# Altium footprint library C210_Rev_B_220601.PcbLib: 80 footprints (part 4 of 5)
Each footprint in its own frame and in the unit in brackets; x right, y up, seen from the top. Pads: shape width x height; smd on the part's side, far side on the other; paste and mask are expansions set on the pad; w line width, h text height; cw(c..) or ccw(c..) is an arc to the next point about the centre after c.
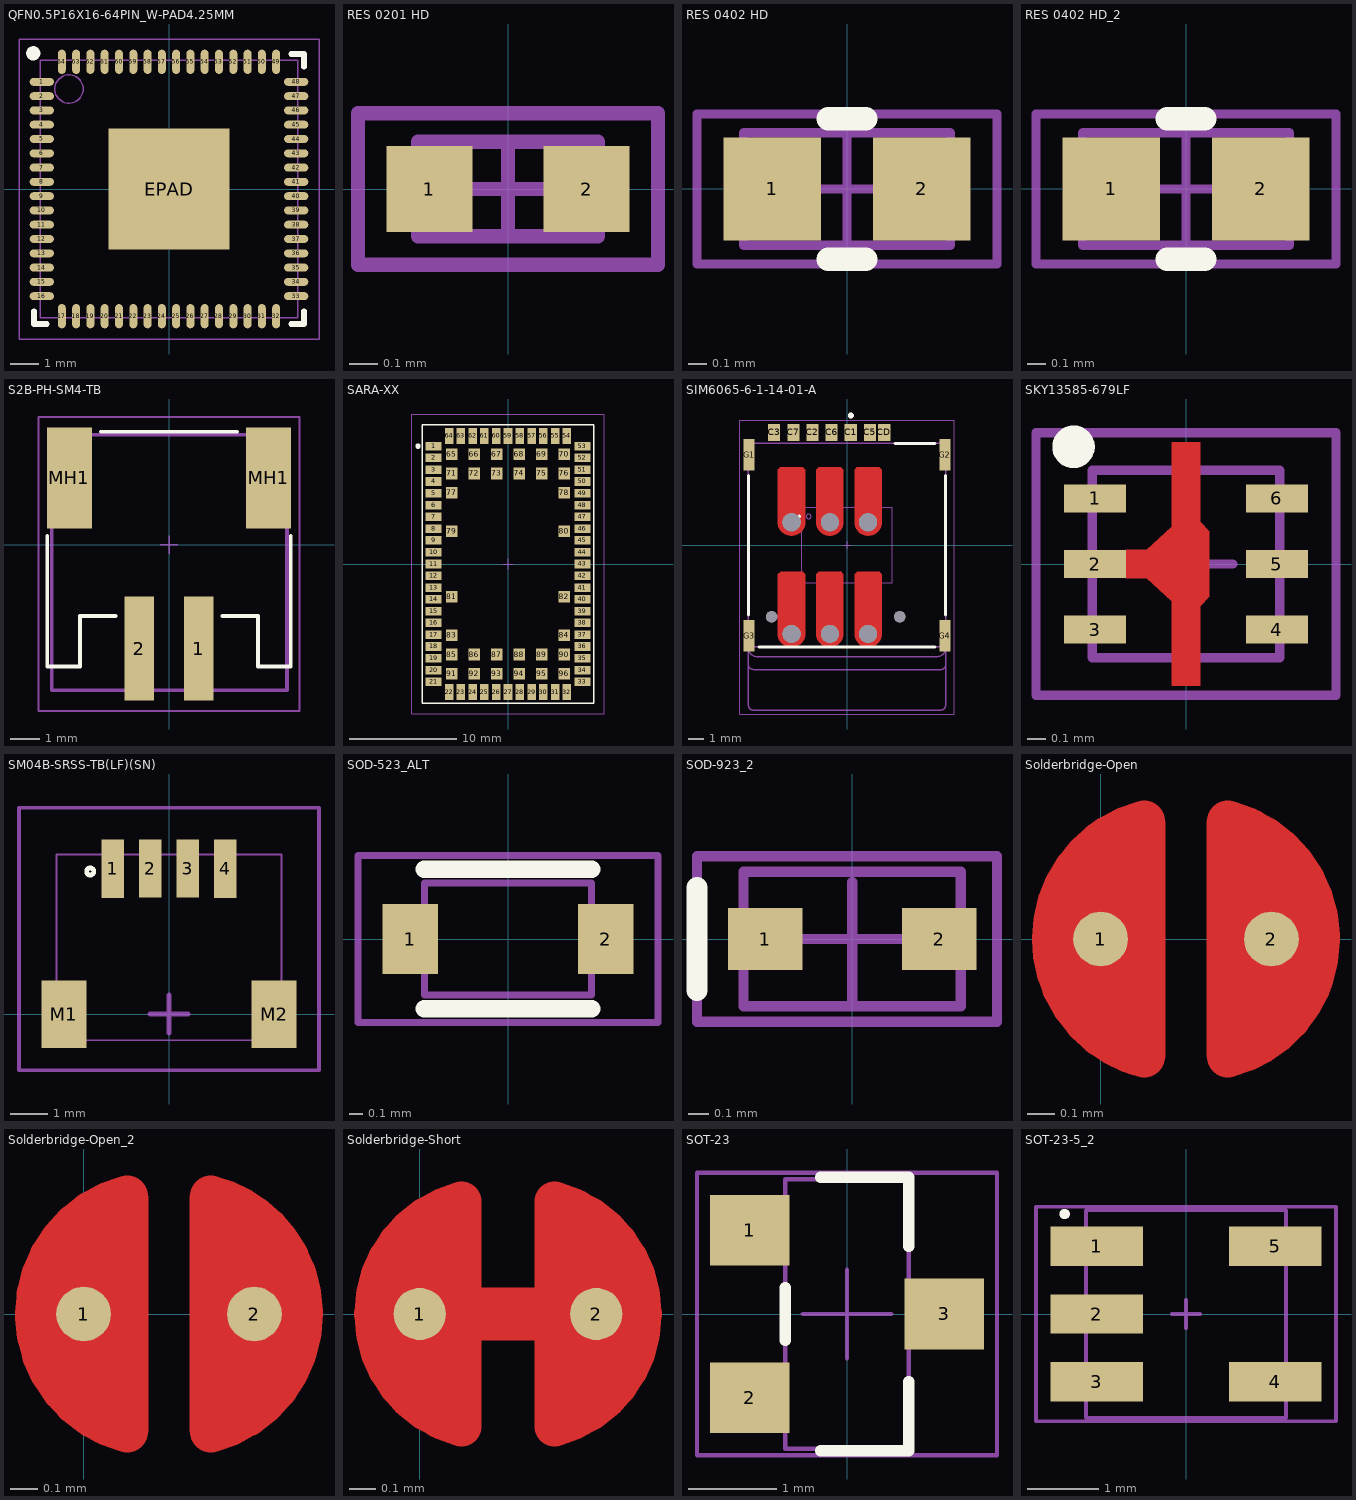
[diagram p3: the footprints below, top view; thin cyan lines are the x and y axes]

## QFN0.5P16X16-64PIN_W-PAD4.25MM [mm]
pads (65):
  oval 0.85x0.28 smd: 1(-4.45,3.75) 2(-4.45,3.25) 3(-4.45,2.75) 4(-4.45,2.25) 5(-4.45,1.75) 6(-4.45,1.25) 7(-4.45,0.75) 8(-4.45,0.25) 9(-4.45,-0.25) 10(-4.45,-0.75) 11(-4.45,-1.25) 12(-4.45,-1.75) 13(-4.45,-2.25) 14(-4.45,-2.75) 15(-4.45,-3.25) 16(-4.45,-3.75) 33(4.45,-3.75) 34(4.45,-3.25) 35(4.45,-2.75) 36(4.45,-2.25) 37(4.45,-1.75) 38(4.45,-1.25) 39(4.45,-0.75) 40(4.45,-0.25) 41(4.45,0.25) 42(4.45,0.75) 43(4.45,1.25) 44(4.45,1.75) 45(4.45,2.25) 46(4.45,2.75) 47(4.45,3.25) 48(4.45,3.75)
  oval 0.28x0.85 smd: 17(-3.75,-4.45) 18(-3.25,-4.45) 19(-2.75,-4.45) 20(-2.25,-4.45) 21(-1.75,-4.45) 22(-1.25,-4.45) 23(-0.75,-4.45) 24(-0.25,-4.45) 25(0.25,-4.45) 26(0.75,-4.45) 27(1.25,-4.45) 28(1.75,-4.45) 29(2.25,-4.45) 30(2.75,-4.45) 31(3.25,-4.45) 32(3.75,-4.45) 49(3.75,4.45) 50(3.25,4.45) 51(2.75,4.45) 52(2.25,4.45) 53(1.75,4.45) 54(1.25,4.45) 55(0.75,4.45) 56(0.25,4.45) 57(-0.25,4.45) 58(-0.75,4.45) 59(-1.25,4.45) 60(-1.75,4.45) 61(-2.25,4.45) 62(-2.75,4.45) 63(-3.25,4.45) 64(-3.75,4.45)
  rect 4.25x4.25 smd paste-2.1: EPAD(0,0)
Top Overlay:
  circle w0.25: c-4.75,4.75 r0.125
  lines w0.2: -4.725,-4.275 -4.725,-4.725 -4.275,-4.725 ; 4.275,-4.725 4.725,-4.725 4.725,-4.275 ; 4.275,4.725 4.725,4.725 4.725,4.275
Top Paste:
  rectangle: -0.575,-0.575 0.575,0.575
  rectangle: -2.025,-0.575 -0.875,0.575
  rectangle: -2.025,-2.025 -0.875,-0.875
  rectangle: -0.575,-2.025 0.575,-0.875
  rectangle: 0.875,-2.025 2.025,-0.875
  rectangle: 0.875,-0.575 2.025,0.575
  rectangle: 0.875,0.875 2.025,2.025
  rectangle: -0.575,0.875 0.575,2.025
  rectangle: -2.025,0.875 -0.875,2.025
Mechanical 11:
  text ".Designator" at -0.033,0.475 h0.5
Mechanical 13:
  circle w0.05: c-3.5,3.5 r0.5
  lines w0.05: -4.5,-4.5 4.5,-4.5 4.5,4.5 -4.5,4.5 -4.5,-4.5
Mechanical 15:
  lines w0.05: -0.5,0 0.5,0 ; 0,-0.5 0,0.5 ; -5.25,-5.25 -5.25,5.25 5.25,5.25 5.25,-5.25 -5.25,-5.25
3D body "User Library-SiLabs QFN64 (9x9).step": height 0.9, standoff 0, extent -4.5,-4.5 4.5,4.5

## RES 0201 HD [mm]
pads (2):
  rect 0.3x0.3 smd mask+0.05: 1(-0.275,0) 2(0.275,0)
Mechanical 11:
  text ".Designator" at -0.6,-0.268 h0.5
Mechanical 13:
  lines w0.05: -0.315,-0.165 -0.315,0.165 0.315,0.165 0.315,-0.165 -0.315,-0.165
Mechanical 15:
  lines w0.05: -0.165,0 0.165,0 ; 0,-0.165 0,0.165 ; -0.525,-0.265 0.525,-0.265 0.525,0.265 -0.525,0.265 -0.525,-0.265
3D body: height 0.25, standoff 0, extent -0.165,-0.165 0.165,0.165
3D body: height 0.25, standoff 0, extent -0.315,-0.165 -0.165,0.165
3D body: height 0.25, standoff 0, extent 0.165,-0.165 0.315,0.165

## RES 0402 HD [mm]
pads (2):
  rect 0.52x0.55 smd: 1(-0.4,0) 2(0.4,0)
Top Overlay:
  lines w0.127: -0.1,-0.375 0.1,-0.375 ; -0.1,0.375 0.1,0.375
Mechanical 11:
  text ".Designator" at 0.725,0.25 h0.5
Mechanical 13:
  lines w0.05: -0.55,-0.3 -0.55,0.3 0.55,0.3 0.55,-0.3 -0.55,-0.3
Mechanical 15:
  lines w0.05: -0.3,0 0.3,0 ; 0,-0.3 0,0.3 ; -0.8,-0.4 -0.8,0.4 0.8,0.4 0.8,-0.4 -0.8,-0.4
3D body: height 0.4, standoff 0, extent -0.35,-0.3 0.35,0.3
3D body: height 0.4, standoff 0, extent -0.55,-0.3 -0.35,0.3
3D body: height 0.4, standoff 0, extent 0.35,-0.3 0.55,0.3

## RES 0402 HD_2 [mm]
pads (2):
  rect 0.52x0.55 smd: 1(-0.4,0) 2(0.4,0)
Top Overlay:
  lines w0.127: -0.1,-0.375 0.1,-0.375 ; -0.1,0.375 0.1,0.375
Mechanical 11:
  text ".Designator" at -0.375,-0.25 h0.5
Mechanical 13:
  lines w0.05: -0.55,-0.3 0.55,-0.3 0.55,0.3 -0.55,0.3 -0.55,-0.3
Mechanical 15:
  lines w0.05: -0.3,0 0.3,0 ; 0,-0.3 0,0.3 ; -0.8,-0.4 0.8,-0.4 0.8,0.4 -0.8,0.4 -0.8,-0.4
3D body: height 0.4, standoff 0, extent -0.35,-0.3 0.35,0.3
3D body: height 0.4, standoff 0, extent -0.55,-0.3 -0.35,0.3
3D body: height 0.4, standoff 0, extent 0.35,-0.3 0.55,0.3

## S2B-PH-SM4-TB [mm]
pads (4):
  rect 1x3.5 smd: 1(1,-3.5) 2(-1,-3.5)
  rect 1.5x3.4 smd: MH1(-3.35,2.25) MH1(3.35,2.25)
Top Overlay:
  lines w0.127: -4.1,0.3 -4.1,-4.1 -3,-4.1 -3,-2.4 -1.8,-2.4 ; -2.3,3.8 2.3,3.8 ; 1.8,-2.4 3,-2.4 3,-4.1 4.1,-4.1 4.1,0.3
Mechanical 11:
  text ".Designator" at -0.575,0.092 h0.5
Mechanical 13:
  lines w0.127: -3.95,-4.9 -3.95,3.7 3.975,3.7 3.975,-4.9 -3.95,-4.9
Mechanical 15:
  lines w0.05: -0.3,0 0.3,0 ; 0,-0.3 0,0.3
  lines w0.064: -4.4,-5.6 4.4,-5.6 4.4,4.3 -4.4,4.3 -4.4,-5.6
3D body "S2B-PH-SM4-TB.STEP": height 5.61, standoff 0.01, extent -3.925,-4.9 3.975,3.7

## SARA-XX [mm]
pads (96):
  rect 1.5x0.8 smd paste-1: 1(-6.95,11) 2(-6.95,9.9) 3(-6.95,8.8) 4(-6.95,7.7) 5(-6.95,6.6) 6(-6.95,5.5) 7(-6.95,4.4) 8(-6.95,3.3) 9(-6.95,2.2) 10(-6.95,1.1) 11(-6.95,0) 12(-6.95,-1.1) 13(-6.95,-2.2) 14(-6.95,-3.3) 15(-6.95,-4.4) 16(-6.95,-5.5) 17(-6.95,-6.6) 18(-6.95,-7.7) 19(-6.95,-8.8) 20(-6.95,-9.9) 21(-6.95,-11) 33(6.95,-11) 34(6.95,-9.9) 35(6.95,-8.8) 36(6.95,-7.7) 37(6.95,-6.6) 38(6.95,-5.5) 39(6.95,-4.4) 40(6.95,-3.3) 41(6.95,-2.2) 42(6.95,-1.1) 43(6.95,0) 44(6.95,1.1) 45(6.95,2.2) 46(6.95,3.3) 47(6.95,4.4) 48(6.95,5.5) 49(6.95,6.6) 50(6.95,7.7) 51(6.95,8.8) 52(6.95,9.9) 53(6.95,11)
  rect 0.8x1.5 smd paste-1: 22(-5.5,-11.95) 23(-4.4,-11.95) 24(-3.3,-11.95) 25(-2.2,-11.95) 26(-1.1,-11.95) 27(0,-11.95) 28(1.1,-11.95) 29(2.2,-11.95) 30(3.3,-11.95) 31(4.4,-11.95) 32(5.5,-11.95) 54(5.5,11.95) 55(4.4,11.95) 56(3.3,11.95) 57(2.2,11.95) 58(1.1,11.95) 59(0,11.95) 60(-1.1,11.95) 61(-2.2,11.95) 62(-3.3,11.95) 63(-4.4,11.95) 64(-5.5,11.95)
  rect 1.1x1.1 smd paste-0.025: 65(-5.25,10.25) 66(-3.15,10.25) 67(-1.05,10.25) 68(1.05,10.25) 69(3.15,10.25) 70(5.25,10.25) 71(-5.25,8.45) 72(-3.15,8.45) 73(-1.05,8.45) 74(1.05,8.45) 75(3.15,8.45) 76(5.25,8.45) 77(-5.25,6.65) 78(5.25,6.65) 79(-5.25,3.05) 80(5.25,3.05) 81(-5.25,-3.05) 82(5.25,-3.05) 83(-5.25,-6.65) 84(5.25,-6.65) 85(-5.25,-8.45) 86(-3.15,-8.45) 87(-1.05,-8.45) 88(1.05,-8.45) 89(3.15,-8.45) 90(5.25,-8.45) 91(-5.25,-10.25) 92(-3.15,-10.25) 93(-1.05,-10.25) 94(1.05,-10.25) 95(3.15,-10.25) 96(5.25,-10.25)
Top Overlay:
  circle w0.4: c-8.4,11 r0.05
  lines w0.15: -8,-13 8,-13 8,13 -8,13 -8,-13
Top Paste:
  rectangle: -7.775,10.625 -6.225,11.375
  rectangle: -7.775,9.525 -6.225,10.275
  rectangle: -7.775,8.425 -6.225,9.175
  rectangle: -7.775,7.325 -6.225,8.075
  rectangle: -7.775,6.225 -6.225,6.975
  rectangle: -7.775,5.125 -6.225,5.875
  rectangle: -7.775,4.025 -6.225,4.775
  rectangle: -7.775,2.925 -6.225,3.675
  rectangle: -7.775,1.825 -6.225,2.575
  rectangle: -7.775,0.725 -6.225,1.475
  rectangle: -7.775,-0.375 -6.225,0.375
  rectangle: -7.775,-1.475 -6.225,-0.725
  rectangle: -7.775,-2.575 -6.225,-1.825
  rectangle: -7.775,-3.675 -6.225,-2.925
  rectangle: -7.775,-4.775 -6.225,-4.025
  rectangle: -7.775,-5.875 -6.225,-5.125
  rectangle: -7.775,-6.975 -6.225,-6.225
  rectangle: -7.775,-8.075 -6.225,-7.325
  rectangle: -7.775,-9.175 -6.225,-8.425
  rectangle: -7.775,-10.275 -6.225,-9.525
  rectangle: -7.775,-11.375 -6.225,-10.625
  region: -5.125,-12.775 -5.125,-11.225 -5.875,-11.225 -5.875,-12.775
  region: -4.025,-12.775 -4.025,-11.225 -4.775,-11.225 -4.775,-12.775
  region: -2.925,-12.775 -2.925,-11.225 -3.675,-11.225 -3.675,-12.775
  region: -1.825,-12.775 -1.825,-11.225 -2.575,-11.225 -2.575,-12.775
  region: -0.725,-12.775 -0.725,-11.225 -1.475,-11.225 -1.475,-12.775
  region: 0.375,-12.775 0.375,-11.225 -0.375,-11.225 -0.375,-12.775
  region: 1.475,-12.775 1.475,-11.225 0.725,-11.225 0.725,-12.775
  region: 2.575,-12.775 2.575,-11.225 1.825,-11.225 1.825,-12.775
  region: 3.675,-12.775 3.675,-11.225 2.925,-11.225 2.925,-12.775
  region: 4.775,-12.775 4.775,-11.225 4.025,-11.225 4.025,-12.775
  region: 5.875,-12.775 5.875,-11.225 5.125,-11.225 5.125,-12.775
  rectangle: 6.225,-11.375 7.775,-10.625
  rectangle: 6.225,-10.275 7.775,-9.525
  rectangle: 6.225,-9.175 7.775,-8.425
  rectangle: 6.225,-8.075 7.775,-7.325
  rectangle: 6.225,-6.975 7.775,-6.225
  rectangle: 6.225,-5.875 7.775,-5.125
  rectangle: 6.225,-4.775 7.775,-4.025
  rectangle: 6.225,-3.675 7.775,-2.925
  rectangle: 6.225,-2.575 7.775,-1.825
  rectangle: 6.225,-1.475 7.775,-0.725
  rectangle: 6.225,-0.375 7.775,0.375
  rectangle: 6.225,0.725 7.775,1.475
  rectangle: 6.225,1.825 7.775,2.575
  rectangle: 6.225,2.925 7.775,3.675
  rectangle: 6.225,4.025 7.775,4.775
  rectangle: 6.225,5.125 7.775,5.875
  rectangle: 6.225,6.225 7.775,6.975
  rectangle: 6.225,7.325 7.775,8.075
  rectangle: 6.225,8.425 7.775,9.175
  rectangle: 6.225,9.525 7.775,10.275
  rectangle: 6.225,10.625 7.775,11.375
  region: 4.775,11.225 4.775,12.775 4.025,12.775 4.025,11.225
  region: 3.675,11.225 3.675,12.775 2.925,12.775 2.925,11.225
  region: 2.575,11.225 2.575,12.775 1.825,12.775 1.825,11.225
  region: 5.875,11.225 5.875,12.775 5.125,12.775 5.125,11.225
  region: 1.475,11.225 1.475,12.775 0.725,12.775 0.725,11.225
  region: 0.375,11.225 0.375,12.775 -0.375,12.775 -0.375,11.225
  region: -0.725,11.225 -0.725,12.775 -1.475,12.775 -1.475,11.225
  region: -1.825,11.225 -1.825,12.775 -2.575,12.775 -2.575,11.225
  region: -2.925,11.225 -2.925,12.775 -3.675,12.775 -3.675,11.225
  region: -4.025,11.225 -4.025,12.775 -4.775,12.775 -4.775,11.225
  region: -5.125,11.225 -5.125,12.775 -5.875,12.775 -5.875,11.225
Mechanical 15:
  lines w0.05: -9,-14 9,-14 9,14 -9,14 -9,-14
  lines w0.1: -0.5,0 0,0 0.5,0 ; 0,-0.5 0,0.5
  text ".Designator" at 0.1,0.433 h1
3D body "SARA-R5_step.STEP": height 2.21, standoff 0.01, extent -8.008,-12.994 7.992,13.006

## SIM6065-6-1-14-01-A [mm]
pads (19):
  rect 0.8x1.14 smd: C1(0.25,7.48) C2(-2.29,7.48) C3(-4.83,7.48) C5(1.52,7.48) C6(-1.02,7.48) C7(-3.56,7.48) CD(2.47,7.48)
  rect 0.7x2.1 smd: G1(-6.5,6) G2(6.5,6) G3(-6.5,-6) G4(6.5,-6)
  round 0.75 hole 0.75 unplated: ""(-5,-4.75) ""(3.5,-4.75)
  round 1.2 hole 1.2 unplated: ""(-3.68,-5.88) ""(-3.68,1.52) ""(-1.14,-5.88) ""(-1.14,1.52) ""(1.4,-5.88) ""(1.4,1.52)
Top Layer:
  pour cut-out: 2.3,4.988 2.3,1.525 2.3,1.436 2.265,1.263 2.198,1.099 2.099,0.951 1.974,0.826 1.826,0.728 1.663,0.66 1.489,0.625 1.4,0.625 1.311,0.625 1.137,0.66 0.974,0.727 0.826,0.826 0.701,0.951 0.602,1.099 0.535,1.263 0.5,1.436 0.5,1.525 0.5,4.995 0.661,5.156 2.133,5.154
  pour cut-out: -0.24,4.988 -0.24,1.525 -0.24,1.436 -0.275,1.263 -0.342,1.099 -0.441,0.951 -0.566,0.826 -0.714,0.728 -0.877,0.66 -1.051,0.625 -1.14,0.625 -1.229,0.625 -1.403,0.66 -1.566,0.727 -1.714,0.826 -1.839,0.951 -1.938,1.099 -2.005,1.263 -2.04,1.436 -2.04,1.525 -2.04,4.995 -1.879,5.156 -0.407,5.154
  pour cut-out: -2.78,4.988 -2.78,1.525 -2.78,1.436 -2.815,1.263 -2.882,1.099 -2.981,0.951 -3.106,0.826 -3.254,0.728 -3.417,0.66 -3.591,0.625 -3.68,0.625 -3.769,0.625 -3.943,0.66 -4.106,0.727 -4.254,0.826 -4.379,0.951 -4.478,1.099 -4.545,1.263 -4.58,1.436 -4.58,1.525 -4.58,4.995 -4.419,5.156 -2.947,5.154
  pour cut-out: 2.3,-1.925 2.3,-5.875 2.3,-5.964 2.265,-6.138 2.198,-6.301 2.099,-6.449 1.974,-6.574 1.826,-6.673 1.663,-6.74 1.489,-6.775 1.4,-6.775 1.311,-6.775 1.137,-6.74 0.974,-6.673 0.826,-6.574 0.701,-6.449 0.602,-6.301 0.535,-6.137 0.5,-5.964 0.5,-5.875 0.5,-1.925 0.675,-1.75 2.114,-1.739
  pour cut-out: -0.24,-1.925 -0.24,-5.875 -0.24,-5.964 -0.275,-6.138 -0.342,-6.301 -0.441,-6.449 -0.566,-6.574 -0.714,-6.673 -0.877,-6.74 -1.051,-6.775 -1.14,-6.775 -1.229,-6.775 -1.403,-6.74 -1.566,-6.673 -1.714,-6.574 -1.839,-6.449 -1.938,-6.301 -2.005,-6.137 -2.04,-5.964 -2.04,-5.875 -2.04,-1.925 -1.865,-1.75 -0.426,-1.739
  pour cut-out: -2.78,-1.925 -2.78,-5.875 -2.78,-5.964 -2.815,-6.138 -2.882,-6.301 -2.981,-6.449 -3.106,-6.574 -3.254,-6.673 -3.417,-6.74 -3.591,-6.775 -3.68,-6.775 -3.769,-6.775 -3.943,-6.74 -4.106,-6.673 -4.254,-6.574 -4.379,-6.449 -4.478,-6.301 -4.545,-6.137 -4.58,-5.964 -4.58,-5.875 -4.58,-1.925 -4.405,-1.75 -2.966,-1.739
Top Overlay:
  circle w0.127: c-3.175,1.905 r0.05
  circle w0.2: c0.25,8.6 r0.1
  lines w0.2: -6.545,-4.63 -6.545,4.63 ; -5.83,-6.75 5.83,-6.75 ; 3.19,6.75 5.83,6.75 ; 6.545,-4.63 6.545,4.63
Mechanical 11:
  text ".Designator" at -0.85,0.1 h0.5
Mechanical 13:
  circle w0.05: c-2.54,1.905 r0.16
  circle w0.2: c0.25,8.6 r0.1
  lines w0.05: -3,-2.5 -3,2.5 3,2.5 3,-2.5 -3,-2.5
  lines w0.1: -6.545,-10.603 ccw(c-6.198,-10.603) -6.198,-10.95 ; -6.545,-10.6 -6.545,-7.9 -6.545,-6.75 ; -6.545,-7.902 ccw(c-6.198,-7.902) -6.198,-8.25 ; -6.2,-10.95 6.2,-10.95 ; -6.2,-8.25 6.2,-8.25 ccw(c6.222,-7.928) 6.545,-7.95 ; 6.198,-10.95 ccw(c6.198,-10.603) 6.545,-10.603 ; 6.545,-10.6 6.545,-7.95 ; -6.545,-6.75 ccw(c-5.947,-6.803) -6,-7.4 6,-7.4 ccw(c5.947,-6.803) 6.545,-6.75 ; -6.545,-6.75 6.545,-6.75 ; -6.545,-6.75 -6.545,6.75 6.545,6.75 6.545,-6.75 ; 6.545,-7.95 6.545,-6.75
Mechanical 15:
  lines w0.05: -0.25,0 0.25,0 ; 0,-0.25 0,0.25 ; 0,-0.1 0,0.1 ; -7.1,-11.2 7.1,-11.2 7.1,8.3 -7.1,8.3 -7.1,-11.2
3D body "SIM8065-6-1-14-01-A.stp": height 1.38, standoff -0.39, extent -6.545,-6.83 6.545,7.75

## SKY13585-679LF [mm]
pads (6):
  rect 0.33x0.15 smd mask+0.05: 1(-0.485,0.35) 2(-0.485,0) 3(-0.485,-0.35) 4(0.485,-0.35) 5(0.485,0) 6(0.485,0.35)
Top Layer:
  region: 0.075,0.225 0.125,0.175 0.125,-0.175 0.075,-0.225
  region: -0.21,-0.075 -0.075,-0.198 -0.075,0.198 -0.21,0.075 -0.321,0.075 -0.321,-0.075
  region: -0.075,0.65 0.075,0.65 0.075,-0.65 -0.075,-0.65
Top Overlay:
  circle w0.127: c-0.6,0.625 r0.05
Top Paste:
  region: 0.075,0.225 0.125,0.175 0.125,-0.175 0.075,-0.225
  region: -0.21,-0.075 -0.075,-0.198 -0.075,0.198 -0.21,0.075 -0.321,0.075 -0.321,-0.075
  region: -0.075,0.65 0.075,0.65 0.075,-0.65 -0.075,-0.65
Top Solder:
  region: -0.275,-0.125 -0.225,-0.125 -0.125,-0.225 -0.125,-0.7 0.125,-0.7 0.125,-0.225 0.175,-0.175 0.175,0.2 0.125,0.25 0.125,0.7 -0.125,0.7 -0.125,0.225 -0.225,0.125 -0.275,0.125
Mechanical 11:
  text ".Designator" at -0.6,-0.3 h0.5
Mechanical 13:
  circle w0.05: c-0.4,0.35 r0.025
  lines w0.05: -0.5,-0.5 -0.5,0.5 0.5,0.5 0.5,-0.5 -0.5,-0.5
Mechanical 15:
  lines w0.05: -0.25,0 0.25,0 ; 0,-0.25 0,0.25 ; 0,-0.1 0,0.1 ; -0.8,-0.7 -0.8,0.7 0.8,0.7 0.8,-0.7 -0.8,-0.7
3D body: height 0.35, standoff 0.01, extent -0.5,-0.5 0.5,0.5
3D body: height 0.36, standoff 0.35, extent -0.5,0.3 -0.3,0.5

## SM04B-SRSS-TB(LF)(SN) [mm]
pads (6):
  rect 0.6x1.55 smd: 1(-1.5,3.875) 2(-0.5,3.875) 3(0.5,3.875) 4(1.5,3.875)
  rect 1.2x1.8 smd: M1(-2.8,0) M2(2.8,0)
Top Overlay:
  circle w0.127: c-2.1,3.8 r0.096
Mechanical 11:
  text ".Designator" at 0.225,1.025 h0.5
Mechanical 13:
  lines w0.05: -3,-0.7 3,-0.7 3,4.255 -3,4.255 -3,-0.7
Mechanical 15:
  lines w0.1: -4,-1.5 4,-1.5 4,5.5 -4,5.5 -4,-1.5
  lines w0.127: -0.508,0 0.508,0 ; 0,-0.508 0,0.508
3D body "SM04B-SRSS-TB.STEP": height 2.96, standoff 0, extent -3,-0.695 3,4.255

## SOD-523_ALT [mm]
pads (2):
  rect 0.4x0.5 smd: 1(-0.7,0) 2(0.7,0)
Top Overlay:
  lines w0.127: -0.6,-0.5 0.6,-0.5 ; -0.6,0.5 0.6,0.5
Mechanical 11:
  text ".Designator" at -0.475,-0.2 h0.5
Mechanical 13:
  lines w0.05: -0.6,-0.4 -0.6,0.4 0.6,0.4 0.6,-0.4 -0.6,-0.4
Mechanical 15:
  lines w0.05: -1.075,-0.6 1.075,-0.6 1.075,0.6 -1.075,0.6 -1.075,-0.6
3D body "User Library-SOD-523F.step": height 0.7, standoff 0, extent -0.8,-0.399 0.8,0.399

## SOD-923_2 [mm]
pads (2):
  rect 0.36x0.3 smd mask+0.05: 1(-0.42,0) 2(0.42,0)
Top Overlay:
  lines w0.102: -0.75,-0.25 -0.75,0.25
Mechanical 11:
  text ".Designator" at 0.329,0.125 h0.5
Mechanical 13:
  lines w0.05: -0.525,-0.325 -0.525,0.325 0.525,0.325 0.525,-0.325 -0.525,-0.325
Mechanical 15:
  lines w0.05: -0.3,0 0.325,0 ; 0,-0.325 0,0.275 ; -0.75,-0.4 -0.75,0.4 0.7,0.4 0.7,-0.4 -0.75,-0.4
3D body "User Library-DIODE_SOD-923.step": height 0.44, standoff 0.01, extent -0.525,-0.325 0.525,0.325

## Solderbridge-Open [mm]
pads (2):
  round 0.2 smd paste-10: 1(0,0) 2(0.625,0)
Top Layer:
  region: 0.389,0.432 0.465,0.505 0.583,0.467 0.648,0.424 0.721,0.351 0.775,0.292 0.833,0.193 0.861,0.099 0.856,-0.122 0.831,-0.193 0.747,-0.33 0.663,-0.411 0.571,-0.469 0.47,-0.5 0.419,-0.483 0.389,-0.43
  region: 0.236,-0.432 0.16,-0.505 0.042,-0.467 -0.023,-0.424 -0.097,-0.351 -0.15,-0.292 -0.208,-0.193 -0.236,-0.099 -0.231,0.122 -0.206,0.193 -0.122,0.33 -0.038,0.411 0.054,0.469 0.155,0.5 0.206,0.483 0.236,0.43
  lines w0.152: 0.159,-0.431 cw(c0.27,0) 0.11,-0.415 cw(c0.27,0) 0.103,-0.412 cw(c0.27,0) 0,-0.353 cw(c0.27,0) -0.137,-0.178 cw(c0.27,0) -0.175,0 cw(c0.27,0) 0,0.353 cw(c0.27,0) 0.025,0.371 cw(c0.27,0) 0.159,0.431 ; 0.465,-0.431 ccw(c0.355,0) 0.762,-0.178 ccw(c0.355,0) 0.774,-0.149 ccw(c0.355,0) 0.799,0 ccw(c0.355,0) 0.799,0.009 ccw(c0.355,0) 0.774,0.149 ccw(c0.355,0) 0.465,0.431
Top Solder:
  circle w0.61: c0.31,0 r0.279

## Solderbridge-Open_2 [mm]
pads (2):
  round 0.2 smd paste-10: 1(0,0) 2(0.625,0)
Top Layer:
  region: 0.236,-0.432 0.16,-0.505 0.042,-0.467 -0.023,-0.424 -0.097,-0.351 -0.15,-0.292 -0.208,-0.193 -0.236,-0.099 -0.231,0.122 -0.206,0.193 -0.122,0.33 -0.038,0.411 0.054,0.469 0.155,0.5 0.206,0.483 0.236,0.43
  region: 0.389,0.432 0.465,0.505 0.583,0.467 0.648,0.424 0.721,0.351 0.775,0.292 0.833,0.193 0.861,0.099 0.856,-0.122 0.831,-0.193 0.747,-0.33 0.663,-0.411 0.571,-0.469 0.47,-0.5 0.419,-0.483 0.389,-0.43
  lines w0.152: 0.159,-0.431 cw(c0.27,0) -0.174,-0.009 cw(c0.27,0) -0.175,0 cw(c0.27,0) 0.025,0.371 cw(c0.27,0) 0.159,0.431 ; 0.465,-0.431 ccw(c0.355,0) 0.774,0.149 ccw(c0.355,0) 0.625,0.353 ccw(c0.355,0) 0.465,0.431
Top Solder:
  circle w0.61: c0.31,0 r0.279

## Solderbridge-Short [mm]
pads (2):
  round 0.2 smd paste-10: 1(0,0) 2(0.676,0)
Top Layer:
  region: 0.44,0.432 0.516,0.505 0.634,0.467 0.698,0.424 0.772,0.351 0.825,0.292 0.884,0.193 0.912,0.099 0.907,-0.122 0.881,-0.193 0.798,-0.33 0.714,-0.411 0.622,-0.469 0.521,-0.5 0.47,-0.483 0.44,-0.43
  region: 0.236,-0.432 0.16,-0.505 0.042,-0.467 -0.023,-0.424 -0.097,-0.351 -0.15,-0.292 -0.208,-0.193 -0.236,-0.099 -0.231,0.122 -0.206,0.193 -0.122,0.33 -0.038,0.411 0.054,0.469 0.155,0.5 0.206,0.483 0.236,0.43
  lines w0.152: 0.159,-0.431 cw(c0.27,0) 0.159,0.431 ; 0.516,-0.431 ccw(c0.406,0) 0.516,0.431
  lines w0.203: 0,0 0.676,0
Top Solder:
  circle w0.61: c0.31,0 r0.279
  circle w0.61: c0.366,0 r0.279

## SOT-23 [mm]
pads (3):
  rect 0.9x0.8 smd: 1(-1.1,0.95) 2(-1.1,-0.95) 3(1.1,0)
Top Overlay:
  lines w0.127: -0.7,-0.3 -0.7,0.3 ; -0.3,-1.55 0.7,-1.55 0.7,-0.763 ; -0.3,1.55 0.7,1.55 0.7,0.763
Mechanical 11:
  text ".Designator" at -0.125,0.3 h0.5
Mechanical 13:
  lines w0.05: -0.7,-1.525 0.7,-1.525 0.7,1.525 -0.7,1.525 -0.7,-1.525
Mechanical 15:
  lines w0.05: -0.5,0 0.5,0 ; 0,-0.5 0,0.5 ; -1.7,-1.6 1.7,-1.6 1.7,1.6 -1.7,1.6 -1.7,-1.6
3D body: height 1.2, standoff 0, extent -0.7,-1.525 0.7,1.525

## SOT-23-5_2 [mm]
pads (5):
  rect 1.3x0.55 smd: 1(-1.25,0.95) 2(-1.25,0) 3(-1.25,-0.95) 4(1.25,-0.95) 5(1.25,0.95)
Top Overlay:
  circle w0.127: c-1.7,1.4 r0.01
Mechanical 11:
  text ".Designator" at -0.25,-0.25 h0.5
Mechanical 13:
  lines w0.05: -1.4,-1.45 1.4,-1.45 1.4,1.45 -1.4,1.45 -1.4,-1.45
Mechanical 15:
  lines w0.05: -0.2,0 0.2,0 ; 0,-0.2 0,0.2 ; -2.1,-1.5 -2.1,1.5 2.1,1.5 2.1,-1.5 -2.1,-1.5
3D body "User Library-SOT23-5-2.step": height 1.45, standoff 0, extent -1.4,-1.45 1.4,1.45